# Altium footprint library PCB_General.PcbLib: 68 footprints (part 5 of 5)
Each footprint in its own frame and in the unit in brackets; x right, y up, seen from the top. Pads: shape width x height; smd on the part's side, far side on the other; paste and mask are expansions set on the pad; w line width, h text height; cw(c..) or ccw(c..) is an arc to the next point about the centre after c.
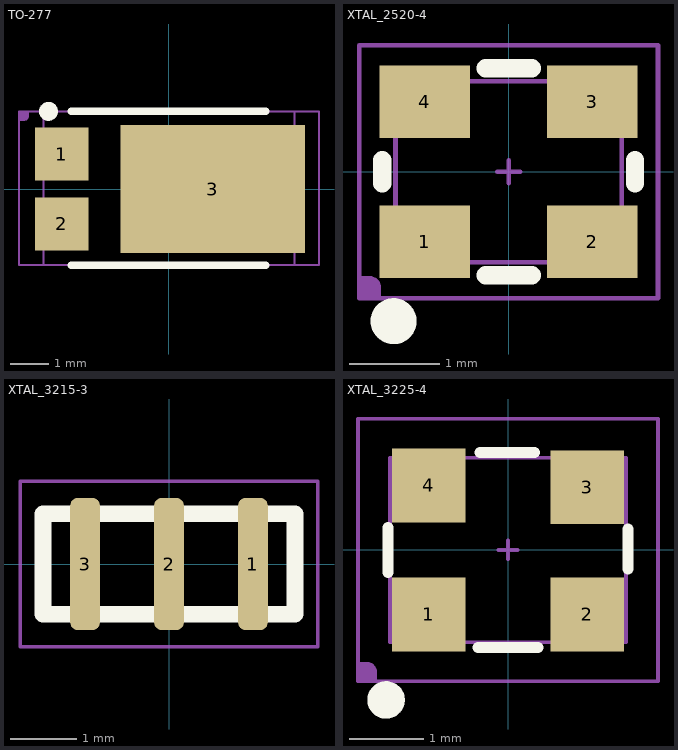
[diagram p4: the footprints below, top view; thin cyan lines are the x and y axes]

## TO-277 [mm]
pads (3):
  rect 1.4x1.39 smd: 1(-2.825,0.92) 2(-2.825,-0.92)
  rect 4.86x3.36 smd: 3(1.157,0)
Top Overlay:
  circle w0.25: c-3.175,2.045 r0.125
  lines w0.2: -2.575,-2.005 2.55,-2.005 ; -2.575,2.045 2.55,2.045
Top Assembly (Mech13):
  lines w0.051: -0.254,0 0.254,0 ; 0,-0.254 0,0.254 ; -3.3,-2.005 3.3,-2.005 3.3,2.045 -3.3,2.045 -3.3,-2.005
Top Component:
  region: -3.95,2.045 -3.696,2.045 -3.696,1.918 -3.696,1.893 -3.715,1.846 -3.751,1.81 -3.798,1.791 -3.823,1.791 -3.95,1.791
  lines w0.051: -3.95,-2.005 -3.95,2.045 3.95,2.045 3.95,-2.005 -3.95,-2.005
  text ".Designator" at -1.676,-0.381 h2.03
3D body "PowerDI-5.STEP": height 1.17, standoff 0.02, extent -3.3,-2.005 3.3,2.045

## XTAL_2520-4 [mm]
pads (4):
  rect 1x0.8 smd: 1(-0.925,-0.775) 2(0.925,-0.775) 3(0.925,0.775) 4(-0.925,0.775)
Top Overlay:
  circle w0.254: c-1.27,-1.651 r0.127
  lines w0.203: -1.397,-0.127 -1.397,0.127 ; -0.254,-1.143 0.254,-1.143 ; -0.254,1.143 0.254,1.143 ; 1.397,-0.127 1.397,0.127
Top Assembly (Mech13):
  lines w0.051: -0.127,0 0.127,0 ; 0,-0.127 0,0.127 ; -1.25,-1 1.25,-1 1.25,1 -1.25,1 -1.25,-1
Top Component:
  region: -1.664,-1.41 -1.664,-1.156 -1.537,-1.156 -1.512,-1.156 -1.465,-1.175 -1.429,-1.211 -1.41,-1.258 -1.41,-1.283 -1.41,-1.41
  lines w0.051: -1.651,-1.397 1.651,-1.397 1.651,1.397 -1.651,1.397 -1.651,-1.397
  text ".Designator" at -0.762,-0.508 h2.03
3D body: height 0.25, standoff 0, extent 0,0 0,0
3D body "Osc_KC2520.STEP": height 0.79, standoff 0, extent -1.25,-1 1.25,1

## XTAL_3215-3 [mm]
pads (3):
  rrect50% 0.45x2 smd: 1(1.27,0) 2(0,0) 3(-1.27,0)
Top Overlay:
  lines w0.254: -1.905,-0.762 1.905,-0.762 1.905,0.762 -1.905,0.762 -1.905,-0.762
Top Assembly (Mech13):
  lines w0.051: -0.127,0 0.127,0 ; 0,-0.127 0,0.127 ; -1.9,-0.8 1.9,-0.8 1.9,0.8 -1.9,0.8 -1.9,-0.8
Top Component:
  lines w0.051: -2.25,-1.25 2.25,-1.25 2.25,1.25 -2.25,1.25 -2.25,-1.25
  text ".Designator" at -1.524,-0.508 h2.03
3D body: height 1, standoff 0, extent -1.9,-0.8 1.9,0.8

## XTAL_3225-4 [mm]
pads (4):
  rect 1x1 smd: 1(-1.074,-0.874) 2(1.074,-0.874) 3(1.074,0.848) 4(-1.074,0.874)
Top Overlay:
  circle w0.254: c-1.651,-2.032 r0.127
  lines w0.152: -1.626,-0.305 -1.626,0.305 ; -0.406,-1.321 0.406,-1.321 ; -0.381,1.321 0.356,1.321 ; 1.626,-0.254 1.626,0.279
Top Assembly (Mech13):
  lines w0.051: -0.127,0 0.127,0 ; 0,-0.127 0,0.127 ; -1.6,-1.25 1.6,-1.25 1.6,1.25 -1.6,1.25 -1.6,-1.25
Top Component:
  region: -2.032,-1.778 -2.032,-1.524 -1.905,-1.524 -1.88,-1.524 -1.833,-1.543 -1.797,-1.579 -1.778,-1.626 -1.778,-1.651 -1.778,-1.778
  lines w0.051: -2.032,-1.778 -2.032,1.778 2.032,1.778 2.032,-1.778 -2.032,-1.778
  text ".Designator" at -1.016,-0.508 h2.03
3D body "osc-3225-1.step": height 0.61, standoff 0, extent -1.6,-1.25 1.6,1.25